# Altium schematic symbol library jlcpcb_2025_04_inductors_extended_0402.schlib: 1396 symbols (part 5 of 8) (continued)
## MLG1005S2N0BTD25 (continued)
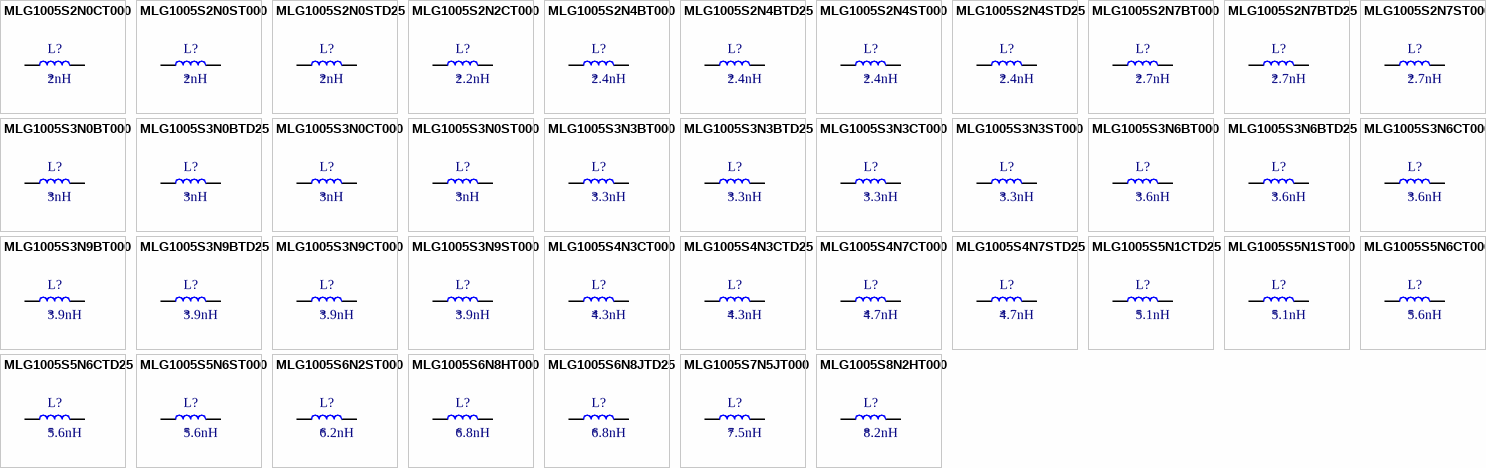
[diagram p20: symbols MLG1005S2N0CT000 to MLG1005S8N2HT000]

## MLG1005S2N0CT000
designator L?  Inductance: 2nH
Inductor, 2nH, 70mΩ, 900mA, SMD 0402; Manufacturer: TDK; Manufacturer Part Number: MLG1005S2N0CT000; Self-Resonant Frequency: 7.5GHz; Q Factor: 7@100MHz; Package Size: 0402; JLCPCB Basic Part: No; JLCPCB Part Number: C98758; Supplier 1: LCSC; Category: Inductors; Supplier Part Number 1: C98758; Rated Current: 900mA; DC Resistance: 70mΩ; RoHS: Yes; ComponentLink1Description: Datasheet; ComponentLink1URL: https://wmsc.lcsc.com/wmsc/upload/file/pdf/v2/lcsc/2304140030_TDK-MLG1005S2N0CT000_C98758.pdf; ComponentLink2Description: JLCPCB Part URL; ComponentLink2URL: https://jlcpcb.com/partdetail/C98758; ComponentLink3Description: LCSC Part URL; ComponentLink3URL: https://lcsc.com/product-detail/Inductors-SMD_TDK-TDK-MLG1005S2N0CT000_C98758.html
footprint IND-0402 (0402 (1005M) Inductor)
pins: 1, 2

## MLG1005S2N0ST000
designator L?  Inductance: 2nH
Inductor, 2nH, 70mΩ, 900mA, SMD 0402; Manufacturer: TDK; Manufacturer Part Number: MLG1005S2N0ST000; Self-Resonant Frequency: 9.3GHz; Q Factor: 7@100MHz; Package Size: 0402; JLCPCB Basic Part: No; JLCPCB Part Number: C98757; Supplier 1: LCSC; Category: Inductors; Supplier Part Number 1: C98757; Rated Current: 900mA; DC Resistance: 70mΩ; RoHS: Yes; ComponentLink1Description: Datasheet; ComponentLink1URL: https://wmsc.lcsc.com/wmsc/upload/file/pdf/v2/lcsc/2304140030_TDK-MLG1005S2N0ST000_C98757.pdf; ComponentLink2Description: JLCPCB Part URL; ComponentLink2URL: https://jlcpcb.com/partdetail/C98757; ComponentLink3Description: LCSC Part URL; ComponentLink3URL: https://lcsc.com/product-detail/Inductors-SMD_TDK-TDK-MLG1005S2N0ST000_C98757.html
footprint IND-0402 (0402 (1005M) Inductor)
pins: 1, 2

## MLG1005S2N0STD25
designator L?  Inductance: 2nH
Inductor, 2nH, 70mΩ, 900mA, SMD 0402; Manufacturer: TDK; Manufacturer Part Number: MLG1005S2N0STD25; Self-Resonant Frequency: 9.3GHz; Q Factor: 7@100MHz; Package Size: 0402; JLCPCB Basic Part: No; JLCPCB Part Number: C880712; Supplier 1: LCSC; Category: Inductors; Supplier Part Number 1: C880712; Rated Current: 900mA; DC Resistance: 70mΩ; RoHS: Yes; ComponentLink1Description: Datasheet; ComponentLink1URL: https://wmsc.lcsc.com/wmsc/upload/file/pdf/v2/lcsc/2304140030_TDK-MLG1005S2N0STD25_C880712.pdf; ComponentLink2Description: JLCPCB Part URL; ComponentLink2URL: https://jlcpcb.com/partdetail/C880712; ComponentLink3Description: LCSC Part URL; ComponentLink3URL: https://lcsc.com/product-detail/Inductors-SMD_TDK-TDK-MLG1005S2N0STD25_C880712.html
footprint IND-0402 (0402 (1005M) Inductor)
pins: 1, 2

## MLG1005S2N2CT000
designator L?  Inductance: 2.2nH
Inductor, 2.2nH, 80mΩ, 900mA, SMD 0402; Manufacturer: TDK; Manufacturer Part Number: MLG1005S2N2CT000; Self-Resonant Frequency: 7GHz; Q Factor: 7@100MHz; Package Size: 0402; JLCPCB Basic Part: No; JLCPCB Part Number: C92035; Supplier 1: LCSC; Category: Inductors; Supplier Part Number 1: C92035; Rated Current: 900mA; DC Resistance: 80mΩ; RoHS: Yes; ComponentLink1Description: Datasheet; ComponentLink1URL: https://wmsc.lcsc.com/wmsc/upload/file/pdf/v2/lcsc/1809261012_TDK-MLG1005S2N2CT000_C92035.pdf; ComponentLink2Description: JLCPCB Part URL; ComponentLink2URL: https://jlcpcb.com/partdetail/C92035; ComponentLink3Description: LCSC Part URL; ComponentLink3URL: https://lcsc.com/product-detail/Inductors-SMD_TDK-TDK-MLG1005S2N2CT000_C92035.html
footprint IND-0402 (0402 (1005M) Inductor)
pins: 1, 2

## MLG1005S2N4BT000
designator L?  Inductance: 2.4nH
Inductor, 2.4nH, 80mΩ, 800mA, SMD 0402; Manufacturer: TDK; Manufacturer Part Number: MLG1005S2N4BT000; Self-Resonant Frequency: 7GHz; Q Factor: 7@100MHz; Package Size: 0402; JLCPCB Basic Part: No; JLCPCB Part Number: C275281; Supplier 1: LCSC; Category: Inductors; Supplier Part Number 1: C275281; Rated Current: 800mA; DC Resistance: 80mΩ; RoHS: Yes; ComponentLink1Description: Datasheet; ComponentLink1URL: https://wmsc.lcsc.com/wmsc/upload/file/pdf/v2/lcsc/2004300931_TDK-MLG1005S2N4BT000_C275281.pdf; ComponentLink2Description: JLCPCB Part URL; ComponentLink2URL: https://jlcpcb.com/partdetail/C275281; ComponentLink3Description: LCSC Part URL; ComponentLink3URL: https://lcsc.com/product-detail/Inductors-SMD_TDK-TDK-MLG1005S2N4BT000_C275281.html
footprint IND-0402 (0402 (1005M) Inductor)
pins: 1, 2

## MLG1005S2N4BTD25
designator L?  Inductance: 2.4nH
Inductor, 2.4nH, 80mΩ, 800mA, SMD 0402; Manufacturer: TDK; Manufacturer Part Number: MLG1005S2N4BTD25; Self-Resonant Frequency: 7GHz; Q Factor: 7@100MHz; Package Size: 0402; JLCPCB Basic Part: No; JLCPCB Part Number: C404619; Supplier 1: LCSC; Category: Inductors; Supplier Part Number 1: C404619; Rated Current: 800mA; DC Resistance: 80mΩ; RoHS: Yes; ComponentLink1Description: Datasheet; ComponentLink1URL: https://wmsc.lcsc.com/wmsc/upload/file/pdf/v2/lcsc/2304140030_TDK-MLG1005S2N4BTD25_C404619.pdf; ComponentLink2Description: JLCPCB Part URL; ComponentLink2URL: https://jlcpcb.com/partdetail/C404619; ComponentLink3Description: LCSC Part URL; ComponentLink3URL: https://lcsc.com/product-detail/Inductors-SMD_TDK-TDK-MLG1005S2N4BTD25_C404619.html
footprint IND-0402 (0402 (1005M) Inductor)
pins: 1, 2

## MLG1005S2N4ST000
designator L?  Inductance: 2.4nH
Inductor, 2.4nH, 80mΩ, 800mA, SMD 0402; Manufacturer: TDK; Manufacturer Part Number: MLG1005S2N4ST000; Self-Resonant Frequency: 8.2GHz; Q Factor: 7@100MHz; Package Size: 0402; JLCPCB Basic Part: No; JLCPCB Part Number: C307724; Supplier 1: LCSC; Category: Inductors; Supplier Part Number 1: C307724; Rated Current: 800mA; DC Resistance: 80mΩ; RoHS: Yes; ComponentLink1Description: Datasheet; ComponentLink1URL: https://wmsc.lcsc.com/wmsc/upload/file/pdf/v2/lcsc/2304140030_TDK-MLG1005S2N4ST000_C307724.pdf; ComponentLink2Description: JLCPCB Part URL; ComponentLink2URL: https://jlcpcb.com/partdetail/C307724; ComponentLink3Description: LCSC Part URL; ComponentLink3URL: https://lcsc.com/product-detail/Inductors-SMD_TDK-TDK-MLG1005S2N4ST000_C307724.html
footprint IND-0402 (0402 (1005M) Inductor)
pins: 1, 2

## MLG1005S2N4STD25
designator L?  Inductance: 2.4nH
Inductor, 2.4nH, 80mΩ, 800mA, SMD 0402; Manufacturer: TDK; Manufacturer Part Number: MLG1005S2N4STD25; Self-Resonant Frequency: 7GHz; Q Factor: 7@100MHz; Package Size: 0402; JLCPCB Basic Part: No; JLCPCB Part Number: C880718; Supplier 1: LCSC; Category: Inductors; Supplier Part Number 1: C880718; Rated Current: 800mA; DC Resistance: 80mΩ; RoHS: Yes; ComponentLink1Description: Datasheet; ComponentLink1URL: https://wmsc.lcsc.com/wmsc/upload/file/pdf/v2/lcsc/2010170835_TDK-MLG1005S2N4STD25_C880718.pdf; ComponentLink2Description: JLCPCB Part URL; ComponentLink2URL: https://jlcpcb.com/partdetail/C880718; ComponentLink3Description: LCSC Part URL; ComponentLink3URL: https://lcsc.com/product-detail/Inductors-SMD_TDK-TDK-MLG1005S2N4STD25_C880718.html
footprint IND-0402 (0402 (1005M) Inductor)
pins: 1, 2

## MLG1005S2N7BT000
designator L?  Inductance: 2.7nH
Inductor, 2.7nH, 80mΩ, 800mA, SMD 0402; Manufacturer: TDK; Manufacturer Part Number: MLG1005S2N7BT000; Self-Resonant Frequency: 6GHz; Q Factor: 7@100MHz; Package Size: 0402; JLCPCB Basic Part: No; JLCPCB Part Number: C275282; Supplier 1: LCSC; Category: Inductors; Supplier Part Number 1: C275282; Rated Current: 800mA; DC Resistance: 80mΩ; RoHS: Yes; ComponentLink1Description: Datasheet; ComponentLink1URL: https://wmsc.lcsc.com/wmsc/upload/file/pdf/v2/lcsc/2304140030_TDK-MLG1005S2N7BT000_C275282.pdf; ComponentLink2Description: JLCPCB Part URL; ComponentLink2URL: https://jlcpcb.com/partdetail/C275282; ComponentLink3Description: LCSC Part URL; ComponentLink3URL: https://lcsc.com/product-detail/Inductors-SMD_TDK-TDK-MLG1005S2N7BT000_C275282.html
footprint IND-0402 (0402 (1005M) Inductor)
pins: 1, 2

## MLG1005S2N7BTD25
designator L?  Inductance: 2.7nH
Inductor, 2.7nH, 80mΩ, 800mA, SMD 0402; Manufacturer: TDK; Manufacturer Part Number: MLG1005S2N7BTD25; Self-Resonant Frequency: 7.3GHz; Q Factor: 7@100MHz; Package Size: 0402; JLCPCB Basic Part: No; JLCPCB Part Number: C360711; Supplier 1: LCSC; Category: Inductors; Supplier Part Number 1: C360711; Rated Current: 800mA; DC Resistance: 80mΩ; RoHS: Yes; ComponentLink1Description: Datasheet; ComponentLink1URL: https://wmsc.lcsc.com/wmsc/upload/file/pdf/v2/lcsc/2304140030_TDK-MLG1005S2N7BTD25_C360711.pdf; ComponentLink2Description: JLCPCB Part URL; ComponentLink2URL: https://jlcpcb.com/partdetail/C360711; ComponentLink3Description: LCSC Part URL; ComponentLink3URL: https://lcsc.com/product-detail/Inductors-SMD_TDK-TDK-MLG1005S2N7BTD25_C360711.html
footprint IND-0402 (0402 (1005M) Inductor)
pins: 1, 2

## MLG1005S2N7ST000
designator L?  Inductance: 2.7nH
Inductor, 2.7nH, 80mΩ, 800mA, SMD 0402; Manufacturer: TDK; Manufacturer Part Number: MLG1005S2N7ST000; Self-Resonant Frequency: 7.3GHz; Q Factor: 7@100MHz; Package Size: 0402; JLCPCB Basic Part: No; JLCPCB Part Number: C76770; Supplier 1: LCSC; Category: Inductors; Supplier Part Number 1: C76770; Rated Current: 800mA; DC Resistance: 80mΩ; RoHS: Yes; ComponentLink1Description: Datasheet; ComponentLink1URL: https://wmsc.lcsc.com/wmsc/upload/file/pdf/v2/lcsc/2304140030_TDK-MLG1005S2N7ST000_C76770.pdf; ComponentLink2Description: JLCPCB Part URL; ComponentLink2URL: https://jlcpcb.com/partdetail/C76770; ComponentLink3Description: LCSC Part URL; ComponentLink3URL: https://lcsc.com/product-detail/Inductors-SMD_TDK-TDK-MLG1005S2N7ST000_C76770.html
footprint IND-0402 (0402 (1005M) Inductor)
pins: 1, 2

## MLG1005S3N0BT000
designator L?  Inductance: 3nH
Inductor, 3nH, 90mΩ, 800mA, SMD 0402; Manufacturer: TDK; Manufacturer Part Number: MLG1005S3N0BT000; Self-Resonant Frequency: 5.5GHz; Q Factor: 7@100MHz; Package Size: 0402; JLCPCB Basic Part: No; JLCPCB Part Number: C275284; Supplier 1: LCSC; Category: Inductors; Supplier Part Number 1: C275284; Rated Current: 800mA; DC Resistance: 90mΩ; RoHS: Yes; ComponentLink1Description: Datasheet; ComponentLink1URL: https://wmsc.lcsc.com/wmsc/upload/file/pdf/v2/lcsc/2304140030_TDK-MLG1005S3N0BT000_C275284.pdf; ComponentLink2Description: JLCPCB Part URL; ComponentLink2URL: https://jlcpcb.com/partdetail/C275284; ComponentLink3Description: LCSC Part URL; ComponentLink3URL: https://lcsc.com/product-detail/Inductors-SMD_TDK-TDK-MLG1005S3N0BT000_C275284.html
footprint IND-0402 (0402 (1005M) Inductor)
pins: 1, 2

## MLG1005S3N0BTD25
designator L?  Inductance: 3nH
Inductor, 3nH, 90mΩ, 800mA, SMD 0402; Manufacturer: TDK; Manufacturer Part Number: MLG1005S3N0BTD25; Self-Resonant Frequency: 6.8GHz; Q Factor: 7@100MHz; Package Size: 0402; JLCPCB Basic Part: No; JLCPCB Part Number: C404620; Supplier 1: LCSC; Category: Inductors; Supplier Part Number 1: C404620; Rated Current: 800mA; DC Resistance: 90mΩ; RoHS: Yes; ComponentLink1Description: Datasheet; ComponentLink1URL: https://wmsc.lcsc.com/wmsc/upload/file/pdf/v2/lcsc/2304140030_TDK-MLG1005S3N0BTD25_C404620.pdf; ComponentLink2Description: JLCPCB Part URL; ComponentLink2URL: https://jlcpcb.com/partdetail/C404620; ComponentLink3Description: LCSC Part URL; ComponentLink3URL: https://lcsc.com/product-detail/Inductors-SMD_TDK-TDK-MLG1005S3N0BTD25_C404620.html
footprint IND-0402 (0402 (1005M) Inductor)
pins: 1, 2

## MLG1005S3N0CT000
designator L?  Inductance: 3nH
Inductor, 3nH, 90mΩ, 800mA, SMD 0402; Manufacturer: TDK; Manufacturer Part Number: MLG1005S3N0CT000; Self-Resonant Frequency: 6.8GHz; Q Factor: 7@100MHz; Package Size: 0402; JLCPCB Basic Part: No; JLCPCB Part Number: C574025; Supplier 1: LCSC; Category: Inductors; Supplier Part Number 1: C574025; Rated Current: 800mA; DC Resistance: 90mΩ; RoHS: Yes; ComponentLink1Description: Datasheet; ComponentLink1URL: https://wmsc.lcsc.com/wmsc/upload/file/pdf/v2/lcsc/2006011905_TDK-MLG1005S3N0CT000_C574025.pdf; ComponentLink2Description: JLCPCB Part URL; ComponentLink2URL: https://jlcpcb.com/partdetail/C574025; ComponentLink3Description: LCSC Part URL; ComponentLink3URL: https://lcsc.com/product-detail/Inductors-SMD_TDK-TDK-MLG1005S3N0CT000_C574025.html
footprint IND-0402 (0402 (1005M) Inductor)
pins: 1, 2

## MLG1005S3N0ST000
designator L?  Inductance: 3nH
Inductor, 3nH, 90mΩ, 800mA, SMD 0402; Manufacturer: TDK; Manufacturer Part Number: MLG1005S3N0ST000; Self-Resonant Frequency: 5.5GHz; Q Factor: 7@100MHz; Package Size: 0402; JLCPCB Basic Part: No; JLCPCB Part Number: C76773; Supplier 1: LCSC; Category: Inductors; Supplier Part Number 1: C76773; Rated Current: 800mA; DC Resistance: 90mΩ; RoHS: Yes; ComponentLink1Description: Datasheet; ComponentLink1URL: https://wmsc.lcsc.com/wmsc/upload/file/pdf/v2/lcsc/2304140030_TDK-MLG1005S3N0ST000_C76773.pdf; ComponentLink2Description: JLCPCB Part URL; ComponentLink2URL: https://jlcpcb.com/partdetail/C76773; ComponentLink3Description: LCSC Part URL; ComponentLink3URL: https://lcsc.com/product-detail/Inductors-SMD_TDK-TDK-MLG1005S3N0ST000_C76773.html
footprint IND-0402 (0402 (1005M) Inductor)
pins: 1, 2

## MLG1005S3N3BT000
designator L?  Inductance: 3.3nH
Inductor, 3.3nH, 90mΩ, 800mA, SMD 0402; Manufacturer: TDK; Manufacturer Part Number: MLG1005S3N3BT000; Self-Resonant Frequency: 5GHz; Q Factor: 8@100MHz; Package Size: 0402; JLCPCB Basic Part: No; JLCPCB Part Number: C87532; Supplier 1: LCSC; Category: Inductors; Supplier Part Number 1: C87532; Rated Current: 800mA; DC Resistance: 90mΩ; RoHS: Yes; ComponentLink1Description: Datasheet; ComponentLink1URL: https://wmsc.lcsc.com/wmsc/upload/file/pdf/v2/lcsc/2304140030_TDK-MLG1005S3N3BT000_C87532.pdf; ComponentLink2Description: JLCPCB Part URL; ComponentLink2URL: https://jlcpcb.com/partdetail/C87532; ComponentLink3Description: LCSC Part URL; ComponentLink3URL: https://lcsc.com/product-detail/Inductors-SMD_TDK-TDK-MLG1005S3N3BT000_C87532.html
footprint IND-0402 (0402 (1005M) Inductor)
pins: 1, 2

## MLG1005S3N3BTD25
designator L?  Inductance: 3.3nH
Inductor, 3.3nH, 90mΩ, 800mA, SMD 0402; Manufacturer: TDK; Manufacturer Part Number: MLG1005S3N3BTD25; Self-Resonant Frequency: 6.1GHz; Q Factor: 8@100MHz; Package Size: 0402; JLCPCB Basic Part: No; JLCPCB Part Number: C360712; Supplier 1: LCSC; Category: Inductors; Supplier Part Number 1: C360712; Rated Current: 800mA; DC Resistance: 90mΩ; RoHS: Yes; ComponentLink1Description: Datasheet; ComponentLink1URL: https://wmsc.lcsc.com/wmsc/upload/file/pdf/v2/lcsc/2304140030_TDK-MLG1005S3N3BTD25_C360712.pdf; ComponentLink2Description: JLCPCB Part URL; ComponentLink2URL: https://jlcpcb.com/partdetail/C360712; ComponentLink3Description: LCSC Part URL; ComponentLink3URL: https://lcsc.com/product-detail/Inductors-SMD_TDK-TDK-MLG1005S3N3BTD25_C360712.html
footprint IND-0402 (0402 (1005M) Inductor)
pins: 1, 2

## MLG1005S3N3CT000
designator L?  Inductance: 3.3nH
Inductor, 3.3nH, 90mΩ, 800mA, SMD 0402; Manufacturer: TDK; Manufacturer Part Number: MLG1005S3N3CT000; Self-Resonant Frequency: 6.1GHz; Q Factor: 8@100MHz; Package Size: 0402; JLCPCB Basic Part: No; JLCPCB Part Number: C275285; Supplier 1: LCSC; Category: Inductors; Supplier Part Number 1: C275285; Rated Current: 800mA; DC Resistance: 90mΩ; RoHS: Yes; ComponentLink1Description: Datasheet; ComponentLink1URL: https://wmsc.lcsc.com/wmsc/upload/file/pdf/v2/lcsc/2304140030_TDK-MLG1005S3N3CT000_C275285.pdf; ComponentLink2Description: JLCPCB Part URL; ComponentLink2URL: https://jlcpcb.com/partdetail/C275285; ComponentLink3Description: LCSC Part URL; ComponentLink3URL: https://lcsc.com/product-detail/Inductors-SMD_TDK-TDK-MLG1005S3N3CT000_C275285.html
footprint IND-0402 (0402 (1005M) Inductor)
pins: 1, 2

## MLG1005S3N3ST000
designator L?  Inductance: 3.3nH
Inductor, 3.3nH, 90mΩ, 800mA, SMD 0402; Manufacturer: TDK; Manufacturer Part Number: MLG1005S3N3ST000; Self-Resonant Frequency: 6.1GHz; Q Factor: 8@100MHz; Package Size: 0402; JLCPCB Basic Part: No; JLCPCB Part Number: C76774; Supplier 1: LCSC; Category: Inductors; Supplier Part Number 1: C76774; Rated Current: 800mA; DC Resistance: 90mΩ; RoHS: Yes; ComponentLink1Description: Datasheet; ComponentLink1URL: https://wmsc.lcsc.com/wmsc/upload/file/pdf/v2/lcsc/2304140030_TDK-MLG1005S3N3ST000_C76774.pdf; ComponentLink2Description: JLCPCB Part URL; ComponentLink2URL: https://jlcpcb.com/partdetail/C76774; ComponentLink3Description: LCSC Part URL; ComponentLink3URL: https://lcsc.com/product-detail/Inductors-SMD_TDK-TDK-MLG1005S3N3ST000_C76774.html
footprint IND-0402 (0402 (1005M) Inductor)
pins: 1, 2

## MLG1005S3N6BT000
designator L?  Inductance: 3.6nH
Inductor, 3.6nH, 90mΩ, 700mA, SMD 0402; Manufacturer: TDK; Manufacturer Part Number: MLG1005S3N6BT000; Self-Resonant Frequency: 5GHz; Q Factor: 8@100MHz; Package Size: 0402; JLCPCB Basic Part: No; JLCPCB Part Number: C275287; Supplier 1: LCSC; Category: Inductors; Supplier Part Number 1: C275287; Rated Current: 700mA; DC Resistance: 90mΩ; RoHS: Yes; ComponentLink1Description: Datasheet; ComponentLink1URL: https://wmsc.lcsc.com/wmsc/upload/file/pdf/v2/lcsc/2304140030_TDK-MLG1005S3N6BT000_C275287.pdf; ComponentLink2Description: JLCPCB Part URL; ComponentLink2URL: https://jlcpcb.com/partdetail/C275287; ComponentLink3Description: LCSC Part URL; ComponentLink3URL: https://lcsc.com/product-detail/Inductors-SMD_TDK-TDK-MLG1005S3N6BT000_C275287.html
footprint IND-0402 (0402 (1005M) Inductor)
pins: 1, 2

## MLG1005S3N6BTD25
designator L?  Inductance: 3.6nH
Inductor, 3.6nH, 90mΩ, 700mA, SMD 0402; Manufacturer: TDK; Manufacturer Part Number: MLG1005S3N6BTD25; Self-Resonant Frequency: 6.7GHz; Q Factor: 8@100MHz; Package Size: 0402; JLCPCB Basic Part: No; JLCPCB Part Number: C404621; Supplier 1: LCSC; Category: Inductors; Supplier Part Number 1: C404621; Rated Current: 700mA; DC Resistance: 90mΩ; RoHS: Yes; ComponentLink1Description: Datasheet; ComponentLink1URL: https://wmsc.lcsc.com/wmsc/upload/file/pdf/v2/lcsc/2304140030_TDK-MLG1005S3N6BTD25_C404621.pdf; ComponentLink2Description: JLCPCB Part URL; ComponentLink2URL: https://jlcpcb.com/partdetail/C404621; ComponentLink3Description: LCSC Part URL; ComponentLink3URL: https://lcsc.com/product-detail/Inductors-SMD_TDK-TDK-MLG1005S3N6BTD25_C404621.html
footprint IND-0402 (0402 (1005M) Inductor)
pins: 1, 2

## MLG1005S3N6CT000
designator L?  Inductance: 3.6nH
Inductor, 3.6nH, 90mΩ, 700mA, SMD 0402; Manufacturer: TDK; Manufacturer Part Number: MLG1005S3N6CT000; Self-Resonant Frequency: 5GHz; Q Factor: 8@100MHz; Package Size: 0402; JLCPCB Basic Part: No; JLCPCB Part Number: C2047385; Supplier 1: LCSC; Category: Inductors; Supplier Part Number 1: C2047385; Rated Current: 700mA; DC Resistance: 90mΩ; RoHS: Yes; ComponentLink1Description: Datasheet; ComponentLink1URL: https://wmsc.lcsc.com/wmsc/upload/file/pdf/v2/lcsc/2304140030_TDK-MLG1005S3N6CT000_C2047385.pdf; ComponentLink2Description: JLCPCB Part URL; ComponentLink2URL: https://jlcpcb.com/partdetail/C2047385; ComponentLink3Description: LCSC Part URL; ComponentLink3URL: https://lcsc.com/product-detail/Inductors-SMD_TDK-TDK-MLG1005S3N6CT000_C2047385.html
footprint IND-0402 (0402 (1005M) Inductor)
pins: 1, 2

## MLG1005S3N9BT000
designator L?  Inductance: 3.9nH
Inductor, 3.9nH, 110mΩ, 700mA, SMD 0402; Manufacturer: TDK; Manufacturer Part Number: MLG1005S3N9BT000; Self-Resonant Frequency: 6.5GHz; Q Factor: 8@100MHz; Package Size: 0402; JLCPCB Basic Part: No; JLCPCB Part Number: C76775; Supplier 1: LCSC; Category: Inductors; Supplier Part Number 1: C76775; Rated Current: 700mA; DC Resistance: 110mΩ; RoHS: Yes; ComponentLink1Description: Datasheet; ComponentLink1URL: https://wmsc.lcsc.com/wmsc/upload/file/pdf/v2/lcsc/2304140030_TDK-MLG1005S3N9BT000_C76775.pdf; ComponentLink2Description: JLCPCB Part URL; ComponentLink2URL: https://jlcpcb.com/partdetail/C76775; ComponentLink3Description: LCSC Part URL; ComponentLink3URL: https://lcsc.com/product-detail/Inductors-SMD_TDK-TDK-MLG1005S3N9BT000_C76775.html
footprint IND-0402 (0402 (1005M) Inductor)
pins: 1, 2

## MLG1005S3N9BTD25
designator L?  Inductance: 3.9nH
Inductor, 3.9nH, 110mΩ, 700mA, SMD 0402; Manufacturer: TDK; Manufacturer Part Number: MLG1005S3N9BTD25; Self-Resonant Frequency: 5GHz; Q Factor: 8@100MHz; Package Size: 0402; JLCPCB Basic Part: No; JLCPCB Part Number: C404622; Supplier 1: LCSC; Category: Inductors; Supplier Part Number 1: C404622; Rated Current: 700mA; DC Resistance: 110mΩ; RoHS: Yes; ComponentLink1Description: Datasheet; ComponentLink1URL: https://wmsc.lcsc.com/wmsc/upload/file/pdf/v2/lcsc/2304140030_TDK-MLG1005S3N9BTD25_C404622.pdf; ComponentLink2Description: JLCPCB Part URL; ComponentLink2URL: https://jlcpcb.com/partdetail/C404622; ComponentLink3Description: LCSC Part URL; ComponentLink3URL: https://lcsc.com/product-detail/Inductors-SMD_TDK-TDK-MLG1005S3N9BTD25_C404622.html
footprint IND-0402 (0402 (1005M) Inductor)
pins: 1, 2

## MLG1005S3N9CT000
designator L?  Inductance: 3.9nH
Inductor, 3.9nH, 110mΩ, 700mA, SMD 0402; Manufacturer: TDK; Manufacturer Part Number: MLG1005S3N9CT000; Self-Resonant Frequency: 5GHz; Q Factor: 8@100MHz; Package Size: 0402; JLCPCB Basic Part: No; JLCPCB Part Number: C89442; Supplier 1: LCSC; Category: Inductors; Supplier Part Number 1: C89442; Rated Current: 700mA; DC Resistance: 110mΩ; RoHS: Yes; ComponentLink1Description: Datasheet; ComponentLink1URL: https://wmsc.lcsc.com/wmsc/upload/file/pdf/v2/lcsc/2304140030_TDK-MLG1005S3N9CT000_C89442.pdf; ComponentLink2Description: JLCPCB Part URL; ComponentLink2URL: https://jlcpcb.com/partdetail/C89442; ComponentLink3Description: LCSC Part URL; ComponentLink3URL: https://lcsc.com/product-detail/Inductors-SMD_TDK-TDK-MLG1005S3N9CT000_C89442.html
footprint IND-0402 (0402 (1005M) Inductor)
pins: 1, 2

## MLG1005S3N9ST000
designator L?  Inductance: 3.9nH
Inductor, 3.9nH, 110mΩ, 700mA, SMD 0402; Manufacturer: TDK; Manufacturer Part Number: MLG1005S3N9ST000; Self-Resonant Frequency: 5GHz; Q Factor: 8@100MHz; Package Size: 0402; JLCPCB Basic Part: No; JLCPCB Part Number: C275288; Supplier 1: LCSC; Category: Inductors; Supplier Part Number 1: C275288; Rated Current: 700mA; DC Resistance: 110mΩ; RoHS: Yes; ComponentLink1Description: Datasheet; ComponentLink1URL: https://wmsc.lcsc.com/wmsc/upload/file/pdf/v2/lcsc/2304140030_TDK-MLG1005S3N9ST000_C275288.pdf; ComponentLink2Description: JLCPCB Part URL; ComponentLink2URL: https://jlcpcb.com/partdetail/C275288; ComponentLink3Description: LCSC Part URL; ComponentLink3URL: https://lcsc.com/product-detail/Inductors-SMD_TDK-TDK-MLG1005S3N9ST000_C275288.html
footprint IND-0402 (0402 (1005M) Inductor)
pins: 1, 2

## MLG1005S4N3CT000
designator L?  Inductance: 4.3nH
Inductor, 4.3nH, 110mΩ, 700mA, SMD 0402; Manufacturer: TDK; Manufacturer Part Number: MLG1005S4N3CT000; Self-Resonant Frequency: 6GHz; Q Factor: 8@100MHz; Package Size: 0402; JLCPCB Basic Part: No; JLCPCB Part Number: C275290; Supplier 1: LCSC; Category: Inductors; Supplier Part Number 1: C275290; Rated Current: 700mA; DC Resistance: 110mΩ; RoHS: Yes; ComponentLink1Description: Datasheet; ComponentLink1URL: https://wmsc.lcsc.com/wmsc/upload/file/pdf/v2/lcsc/1810061616_TDK-MLG1005S4N3CT000_C275290.pdf; ComponentLink2Description: JLCPCB Part URL; ComponentLink2URL: https://jlcpcb.com/partdetail/C275290; ComponentLink3Description: LCSC Part URL; ComponentLink3URL: https://lcsc.com/product-detail/Inductors-SMD_TDK-TDK-MLG1005S4N3CT000_C275290.html
footprint IND-0402 (0402 (1005M) Inductor)
pins: 1, 2

## MLG1005S4N3CTD25
designator L?  Inductance: 4.3nH
Inductor, 4.3nH, 110mΩ, 700mA, SMD 0402; Manufacturer: TDK; Manufacturer Part Number: MLG1005S4N3CTD25; Self-Resonant Frequency: 6GHz; Q Factor: 8@100MHz; Package Size: 0402; JLCPCB Basic Part: No; JLCPCB Part Number: C404623; Supplier 1: LCSC; Category: Inductors; Supplier Part Number 1: C404623; Rated Current: 700mA; DC Resistance: 110mΩ; RoHS: Yes; ComponentLink1Description: Datasheet; ComponentLink1URL: https://wmsc.lcsc.com/wmsc/upload/file/pdf/v2/lcsc/2304140030_TDK-MLG1005S4N3CTD25_C404623.pdf; ComponentLink2Description: JLCPCB Part URL; ComponentLink2URL: https://jlcpcb.com/partdetail/C404623; ComponentLink3Description: LCSC Part URL; ComponentLink3URL: https://lcsc.com/product-detail/Inductors-SMD_TDK-TDK-MLG1005S4N3CTD25_C404623.html
footprint IND-0402 (0402 (1005M) Inductor)
pins: 1, 2

## MLG1005S4N7CT000
designator L?  Inductance: 4.7nH
Inductor, 4.7nH, 120mΩ, 700mA, SMD 0402; Manufacturer: TDK; Manufacturer Part Number: MLG1005S4N7CT000; Self-Resonant Frequency: 4.5GHz; Q Factor: 8@100MHz; Package Size: 0402; JLCPCB Basic Part: No; JLCPCB Part Number: C275292; Supplier 1: LCSC; Category: Inductors; Supplier Part Number 1: C275292; Rated Current: 700mA; DC Resistance: 120mΩ; RoHS: Yes; ComponentLink1Description: Datasheet; ComponentLink1URL: https://wmsc.lcsc.com/wmsc/upload/file/pdf/v2/lcsc/2304140030_TDK-MLG1005S4N7CT000_C275292.pdf; ComponentLink2Description: JLCPCB Part URL; ComponentLink2URL: https://jlcpcb.com/partdetail/C275292; ComponentLink3Description: LCSC Part URL; ComponentLink3URL: https://lcsc.com/product-detail/Inductors-SMD_TDK-TDK-MLG1005S4N7CT000_C275292.html
footprint IND-0402 (0402 (1005M) Inductor)
pins: 1, 2

## MLG1005S4N7STD25
designator L?  Inductance: 4.7nH
Inductor, 4.7nH, 120mΩ, 700mA, SMD 0402; Manufacturer: TDK; Manufacturer Part Number: MLG1005S4N7STD25; Self-Resonant Frequency: 5.4GHz; Q Factor: 8@100MHz; Package Size: 0402; JLCPCB Basic Part: No; JLCPCB Part Number: C307728; Supplier 1: LCSC; Category: Inductors; Supplier Part Number 1: C307728; Rated Current: 700mA; DC Resistance: 120mΩ; RoHS: Yes; ComponentLink1Description: Datasheet; ComponentLink1URL: https://wmsc.lcsc.com/wmsc/upload/file/pdf/v2/lcsc/2304140030_TDK-MLG1005S4N7STD25_C307728.pdf; ComponentLink2Description: JLCPCB Part URL; ComponentLink2URL: https://jlcpcb.com/partdetail/C307728; ComponentLink3Description: LCSC Part URL; ComponentLink3URL: https://lcsc.com/product-detail/Inductors-SMD_TDK-TDK-MLG1005S4N7STD25_C307728.html
footprint IND-0402 (0402 (1005M) Inductor)
pins: 1, 2

## MLG1005S5N1CTD25
designator L?  Inductance: 5.1nH
Inductor, 5.1nH, 130mΩ, 600mA, SMD 0402; Manufacturer: TDK; Manufacturer Part Number: MLG1005S5N1CTD25; Self-Resonant Frequency: 5GHz; Q Factor: 8@100MHz; Package Size: 0402; JLCPCB Basic Part: No; JLCPCB Part Number: C404625; Supplier 1: LCSC; Category: Inductors; Supplier Part Number 1: C404625; Rated Current: 600mA; DC Resistance: 130mΩ; RoHS: Yes; ComponentLink1Description: Datasheet; ComponentLink1URL: https://wmsc.lcsc.com/wmsc/upload/file/pdf/v2/lcsc/2304140030_TDK-MLG1005S5N1CTD25_C404625.pdf; ComponentLink2Description: JLCPCB Part URL; ComponentLink2URL: https://jlcpcb.com/partdetail/C404625; ComponentLink3Description: LCSC Part URL; ComponentLink3URL: https://lcsc.com/product-detail/Inductors-SMD_TDK-TDK-MLG1005S5N1CTD25_C404625.html
footprint IND-0402 (0402 (1005M) Inductor)
pins: 1, 2

## MLG1005S5N1ST000
designator L?  Inductance: 5.1nH
Inductor, 5.1nH, 130mΩ, 600mA, SMD 0402; Manufacturer: TDK; Manufacturer Part Number: MLG1005S5N1ST000; Self-Resonant Frequency: 4GHz; Q Factor: 8@100MHz; Package Size: 0402; JLCPCB Basic Part: No; JLCPCB Part Number: C89443; Supplier 1: LCSC; Category: Inductors; Supplier Part Number 1: C89443; Rated Current: 600mA; DC Resistance: 130mΩ; RoHS: Yes; ComponentLink1Description: Datasheet; ComponentLink1URL: https://wmsc.lcsc.com/wmsc/upload/file/pdf/v2/lcsc/2304140030_TDK-MLG1005S5N1ST000_C89443.pdf; ComponentLink2Description: JLCPCB Part URL; ComponentLink2URL: https://jlcpcb.com/partdetail/C89443; ComponentLink3Description: LCSC Part URL; ComponentLink3URL: https://lcsc.com/product-detail/Inductors-SMD_TDK-TDK-MLG1005S5N1ST000_C89443.html
footprint IND-0402 (0402 (1005M) Inductor)
pins: 1, 2

## MLG1005S5N6CT000
designator L?  Inductance: 5.6nH
Inductor, 5.6nH, 140mΩ, 600mA, SMD 0402; Manufacturer: TDK; Manufacturer Part Number: MLG1005S5N6CT000; Self-Resonant Frequency: 5.3GHz; Q Factor: 8@100MHz; Package Size: 0402; JLCPCB Basic Part: No; JLCPCB Part Number: C275295; Supplier 1: LCSC; Category: Inductors; Supplier Part Number 1: C275295; Rated Current: 600mA; DC Resistance: 140mΩ; RoHS: Yes; ComponentLink1Description: Datasheet; ComponentLink1URL: https://wmsc.lcsc.com/wmsc/upload/file/pdf/v2/lcsc/2304140030_TDK-MLG1005S5N6CT000_C275295.pdf; ComponentLink2Description: JLCPCB Part URL; ComponentLink2URL: https://jlcpcb.com/partdetail/C275295; ComponentLink3Description: LCSC Part URL; ComponentLink3URL: https://lcsc.com/product-detail/Inductors-SMD_TDK-TDK-MLG1005S5N6CT000_C275295.html
footprint IND-0402 (0402 (1005M) Inductor)
pins: 1, 2

## MLG1005S5N6CTD25
designator L?  Inductance: 5.6nH
Inductor, 5.6nH, 140mΩ, 600mA, SMD 0402; Manufacturer: TDK; Manufacturer Part Number: MLG1005S5N6CTD25; Self-Resonant Frequency: 5.3GHz; Q Factor: 8@100MHz; Package Size: 0402; JLCPCB Basic Part: No; JLCPCB Part Number: C404626; Supplier 1: LCSC; Category: Inductors; Supplier Part Number 1: C404626; Rated Current: 600mA; DC Resistance: 140mΩ; RoHS: Yes; ComponentLink1Description: Datasheet; ComponentLink1URL: https://wmsc.lcsc.com/wmsc/upload/file/pdf/v2/lcsc/2304140030_TDK-MLG1005S5N6CTD25_C404626.pdf; ComponentLink2Description: JLCPCB Part URL; ComponentLink2URL: https://jlcpcb.com/partdetail/C404626; ComponentLink3Description: LCSC Part URL; ComponentLink3URL: https://lcsc.com/product-detail/Inductors-SMD_TDK-TDK-MLG1005S5N6CTD25_C404626.html
footprint IND-0402 (0402 (1005M) Inductor)
pins: 1, 2

## MLG1005S5N6ST000
designator L?  Inductance: 5.6nH
Inductor, 5.6nH, 140mΩ, 600mA, SMD 0402; Manufacturer: TDK; Manufacturer Part Number: MLG1005S5N6ST000; Self-Resonant Frequency: 5.3GHz; Q Factor: 8@100MHz; Package Size: 0402; JLCPCB Basic Part: No; JLCPCB Part Number: C275296; Supplier 1: LCSC; Category: Inductors; Supplier Part Number 1: C275296; Rated Current: 600mA; DC Resistance: 140mΩ; RoHS: Yes; ComponentLink1Description: Datasheet; ComponentLink1URL: https://wmsc.lcsc.com/wmsc/upload/file/pdf/v2/lcsc/2304140030_TDK-MLG1005S5N6ST000_C275296.pdf; ComponentLink2Description: JLCPCB Part URL; ComponentLink2URL: https://jlcpcb.com/partdetail/C275296; ComponentLink3Description: LCSC Part URL; ComponentLink3URL: https://lcsc.com/product-detail/Inductors-SMD_TDK-TDK-MLG1005S5N6ST000_C275296.html
footprint IND-0402 (0402 (1005M) Inductor)
pins: 1, 2

## MLG1005S6N2ST000
designator L?  Inductance: 6.2nH
Inductor, 6.2nH, 160mΩ, 600mA, SMD 0402; Manufacturer: TDK; Manufacturer Part Number: MLG1005S6N2ST000; Self-Resonant Frequency: 4GHz; Q Factor: 8@100MHz; Package Size: 0402; JLCPCB Basic Part: No; JLCPCB Part Number: C87534; Supplier 1: LCSC; Category: Inductors; Supplier Part Number 1: C87534; Rated Current: 600mA; DC Resistance: 160mΩ; RoHS: Yes; ComponentLink1Description: Datasheet; ComponentLink1URL: https://wmsc.lcsc.com/wmsc/upload/file/pdf/v2/lcsc/2304140030_TDK-MLG1005S6N2ST000_C87534.pdf; ComponentLink2Description: JLCPCB Part URL; ComponentLink2URL: https://jlcpcb.com/partdetail/C87534; ComponentLink3Description: LCSC Part URL; ComponentLink3URL: https://lcsc.com/product-detail/Inductors-SMD_TDK-TDK-MLG1005S6N2ST000_C87534.html
footprint IND-0402 (0402 (1005M) Inductor)
pins: 1, 2

## MLG1005S6N8HT000
designator L?  Inductance: 6.8nH
Inductor, 6.8nH, ±3%, 150mΩ, 600mA, SMD 0402; Manufacturer: TDK; Manufacturer Part Number: MLG1005S6N8HT000; Self-Resonant Frequency: 3.5GHz; Q Factor: 8@100MHz; Package Size: 0402; JLCPCB Basic Part: No; JLCPCB Part Number: C87535; Supplier 1: LCSC; Category: Inductors; Supplier Part Number 1: C87535; Tolerance: ±3%; Rated Current: 600mA; DC Resistance: 150mΩ; RoHS: Yes; ComponentLink1Description: Datasheet; ComponentLink1URL: https://wmsc.lcsc.com/wmsc/upload/file/pdf/v2/lcsc/2304140030_TDK-MLG1005S6N8HT000_C87535.pdf; ComponentLink2Description: JLCPCB Part URL; ComponentLink2URL: https://jlcpcb.com/partdetail/C87535; ComponentLink3Description: LCSC Part URL; ComponentLink3URL: https://lcsc.com/product-detail/Inductors-SMD_TDK-TDK-MLG1005S6N8HT000_C87535.html
footprint IND-0402 (0402 (1005M) Inductor)
pins: 1, 2

## MLG1005S6N8JTD25
designator L?  Inductance: 6.8nH
Inductor, 6.8nH, ±5%, 150mΩ, 600mA, SMD 0402; Manufacturer: TDK; Manufacturer Part Number: MLG1005S6N8JTD25; Self-Resonant Frequency: 3.5GHz; Q Factor: 8@100MHz; Package Size: 0402; JLCPCB Basic Part: No; JLCPCB Part Number: C2042550; Supplier 1: LCSC; Category: Inductors; Supplier Part Number 1: C2042550; Tolerance: ±5%; Rated Current: 600mA; DC Resistance: 150mΩ; RoHS: Yes; ComponentLink1Description: Datasheet; ComponentLink1URL: https://wmsc.lcsc.com/wmsc/upload/file/pdf/v2/lcsc/2304140030_TDK-MLG1005S6N8JTD25_C2042550.pdf; ComponentLink2Description: JLCPCB Part URL; ComponentLink2URL: https://jlcpcb.com/partdetail/C2042550; ComponentLink3Description: LCSC Part URL; ComponentLink3URL: https://lcsc.com/product-detail/Inductors-SMD_TDK-TDK-MLG1005S6N8JTD25_C2042550.html
footprint IND-0402 (0402 (1005M) Inductor)
pins: 1, 2

## MLG1005S7N5JT000
designator L?  Inductance: 7.5nH
Inductor, 7.5nH, ±5%, 150mΩ, 500mA, SMD 0402; Manufacturer: TDK; Manufacturer Part Number: MLG1005S7N5JT000; Self-Resonant Frequency: 4.1GHz; Q Factor: 8@100MHz; Package Size: 0402; JLCPCB Basic Part: No; JLCPCB Part Number: C87536; Supplier 1: LCSC; Category: Inductors; Supplier Part Number 1: C87536; Tolerance: ±5%; Rated Current: 500mA; DC Resistance: 150mΩ; RoHS: Yes; ComponentLink1Description: Datasheet; ComponentLink1URL: https://wmsc.lcsc.com/wmsc/upload/file/pdf/v2/lcsc/2304140030_TDK-MLG1005S7N5JT000_C87536.pdf; ComponentLink2Description: JLCPCB Part URL; ComponentLink2URL: https://jlcpcb.com/partdetail/C87536; ComponentLink3Description: LCSC Part URL; ComponentLink3URL: https://lcsc.com/product-detail/Inductors-SMD_TDK-TDK-MLG1005S7N5JT000_C87536.html
footprint IND-0402 (0402 (1005M) Inductor)
pins: 1, 2

## MLG1005S8N2HT000
designator L?  Inductance: 8.2nH
Inductor, 8.2nH, ±3%, 190mΩ, 500mA, SMD 0402; Manufacturer: TDK; Manufacturer Part Number: MLG1005S8N2HT000; Self-Resonant Frequency: 4GHz; Q Factor: 8@100MHz; Package Size: 0402; JLCPCB Basic Part: No; JLCPCB Part Number: C76778; Supplier 1: LCSC; Category: Inductors; Supplier Part Number 1: C76778; Tolerance: ±3%; Rated Current: 500mA; DC Resistance: 190mΩ; RoHS: Yes; ComponentLink1Description: Datasheet; ComponentLink1URL: https://wmsc.lcsc.com/wmsc/upload/file/pdf/v2/lcsc/2304140030_TDK-MLG1005S8N2HT000_C76778.pdf; ComponentLink2Description: JLCPCB Part URL; ComponentLink2URL: https://jlcpcb.com/partdetail/C76778; ComponentLink3Description: LCSC Part URL; ComponentLink3URL: https://lcsc.com/product-detail/Inductors-SMD_TDK-TDK-MLG1005S8N2HT000_C76778.html
footprint IND-0402 (0402 (1005M) Inductor)
pins: 1, 2

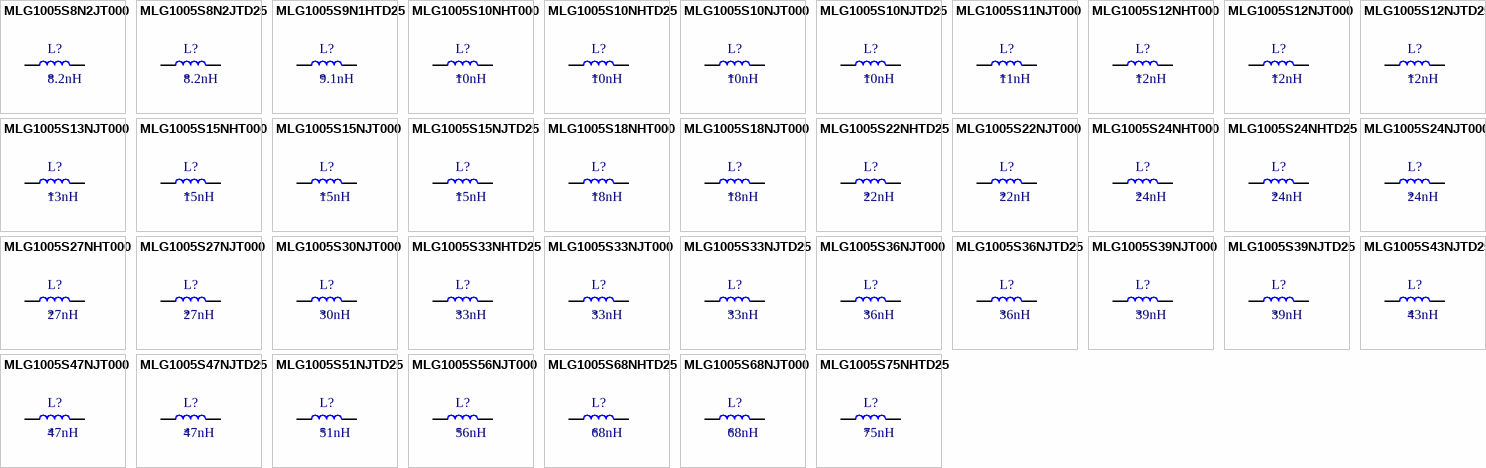
[diagram p21: symbols MLG1005S8N2JT000 to MLG1005S75NHTD25]

## MLG1005S8N2JT000
designator L?  Inductance: 8.2nH
Inductor, 8.2nH, ±5%, 190mΩ, 500mA, SMD 0402; Manufacturer: TDK; Manufacturer Part Number: MLG1005S8N2JT000; Self-Resonant Frequency: 4GHz; Q Factor: 8@100MHz; Package Size: 0402; JLCPCB Basic Part: No; JLCPCB Part Number: C275302; Supplier 1: LCSC; Category: Inductors; Supplier Part Number 1: C275302; Tolerance: ±5%; Rated Current: 500mA; DC Resistance: 190mΩ; RoHS: Yes; ComponentLink1Description: Datasheet; ComponentLink1URL: https://wmsc.lcsc.com/wmsc/upload/file/pdf/v2/lcsc/2304140030_TDK-MLG1005S8N2JT000_C275302.pdf; ComponentLink2Description: JLCPCB Part URL; ComponentLink2URL: https://jlcpcb.com/partdetail/C275302; ComponentLink3Description: LCSC Part URL; ComponentLink3URL: https://lcsc.com/product-detail/Inductors-SMD_TDK-TDK-MLG1005S8N2JT000_C275302.html
footprint IND-0402 (0402 (1005M) Inductor)
pins: 1, 2

## MLG1005S8N2JTD25
designator L?  Inductance: 8.2nH
Inductor, 8.2nH, ±5%, 190mΩ, 500mA, SMD 0402; Manufacturer: TDK; Manufacturer Part Number: MLG1005S8N2JTD25; Self-Resonant Frequency: 3GHz; Q Factor: 8@100MHz; Package Size: 0402; JLCPCB Basic Part: No; JLCPCB Part Number: C2042251; Supplier 1: LCSC; Category: Inductors; Supplier Part Number 1: C2042251; Tolerance: ±5%; Rated Current: 500mA; DC Resistance: 190mΩ; RoHS: Yes; ComponentLink1Description: Datasheet; ComponentLink1URL: https://wmsc.lcsc.com/wmsc/upload/file/pdf/v2/lcsc/2304140030_TDK-MLG1005S8N2JTD25_C2042251.pdf; ComponentLink2Description: JLCPCB Part URL; ComponentLink2URL: https://jlcpcb.com/partdetail/C2042251; ComponentLink3Description: LCSC Part URL; ComponentLink3URL: https://lcsc.com/product-detail/Inductors-SMD_TDK-TDK-MLG1005S8N2JTD25_C2042251.html
footprint IND-0402 (0402 (1005M) Inductor)
pins: 1, 2

## MLG1005S9N1HTD25
designator L?  Inductance: 9.1nH
Inductor, 9.1nH, ±3%, 200mΩ, 500mA, SMD 0402; Manufacturer: TDK; Manufacturer Part Number: MLG1005S9N1HTD25; Self-Resonant Frequency: 3.8GHz; Q Factor: 8@100MHz; Package Size: 0402; JLCPCB Basic Part: No; JLCPCB Part Number: C404631; Supplier 1: LCSC; Category: Inductors; Supplier Part Number 1: C404631; Tolerance: ±3%; Rated Current: 500mA; DC Resistance: 200mΩ; RoHS: Yes; ComponentLink1Description: Datasheet; ComponentLink1URL: https://wmsc.lcsc.com/wmsc/upload/file/pdf/v2/lcsc/2304140030_TDK-MLG1005S9N1HTD25_C404631.pdf; ComponentLink2Description: JLCPCB Part URL; ComponentLink2URL: https://jlcpcb.com/partdetail/C404631; ComponentLink3Description: LCSC Part URL; ComponentLink3URL: https://lcsc.com/product-detail/Inductors-SMD_TDK-TDK-MLG1005S9N1HTD25_C404631.html
footprint IND-0402 (0402 (1005M) Inductor)
pins: 1, 2

## MLG1005S10NHT000
designator L?  Inductance: 10nH
Inductor, 10nH, ±3%, 220mΩ, 500mA, SMD 0402; Manufacturer: TDK; Manufacturer Part Number: MLG1005S10NHT000; Self-Resonant Frequency: 2.5GHz; Q Factor: 8@100MHz; Package Size: 0402; JLCPCB Basic Part: No; JLCPCB Part Number: C76760; Supplier 1: LCSC; Category: Inductors; Supplier Part Number 1: C76760; Tolerance: ±3%; Rated Current: 500mA; DC Resistance: 220mΩ; RoHS: Yes; ComponentLink1Description: Datasheet; ComponentLink1URL: https://wmsc.lcsc.com/wmsc/upload/file/pdf/v2/lcsc/2304140030_TDK-MLG1005S10NHT000_C76760.pdf; ComponentLink2Description: JLCPCB Part URL; ComponentLink2URL: https://jlcpcb.com/partdetail/C76760; ComponentLink3Description: LCSC Part URL; ComponentLink3URL: https://lcsc.com/product-detail/Inductors-SMD_TDK-TDK-MLG1005S10NHT000_C76760.html
footprint IND-0402 (0402 (1005M) Inductor)
pins: 1, 2

## MLG1005S10NHTD25
designator L?  Inductance: 10nH
Inductor, 10nH, ±3%, 220mΩ, 500mA, SMD 0402; Manufacturer: TDK; Manufacturer Part Number: MLG1005S10NHTD25; Self-Resonant Frequency: 3.4GHz; Q Factor: 8@100MHz; Package Size: 0402; JLCPCB Basic Part: No; JLCPCB Part Number: C404632; Supplier 1: LCSC; Category: Inductors; Supplier Part Number 1: C404632; Tolerance: ±3%; Rated Current: 500mA; DC Resistance: 220mΩ; RoHS: Yes; ComponentLink1Description: Datasheet; ComponentLink1URL: https://wmsc.lcsc.com/wmsc/upload/file/pdf/v2/lcsc/2304140030_TDK-MLG1005S10NHTD25_C404632.pdf; ComponentLink2Description: JLCPCB Part URL; ComponentLink2URL: https://jlcpcb.com/partdetail/C404632; ComponentLink3Description: LCSC Part URL; ComponentLink3URL: https://lcsc.com/product-detail/Inductors-SMD_TDK-TDK-MLG1005S10NHTD25_C404632.html
footprint IND-0402 (0402 (1005M) Inductor)
pins: 1, 2
